# Altium footprint library HedefProjem.PcbLib: 35 footprints (part 2 of 3)
Each footprint in its own frame and in the unit in brackets; x right, y up, seen from the top. Pads: shape width x height; smd on the part's side, far side on the other; paste and mask are expansions set on the pad; w line width, h text height; cw(c..) or ccw(c..) is an arc to the next point about the centre after c.
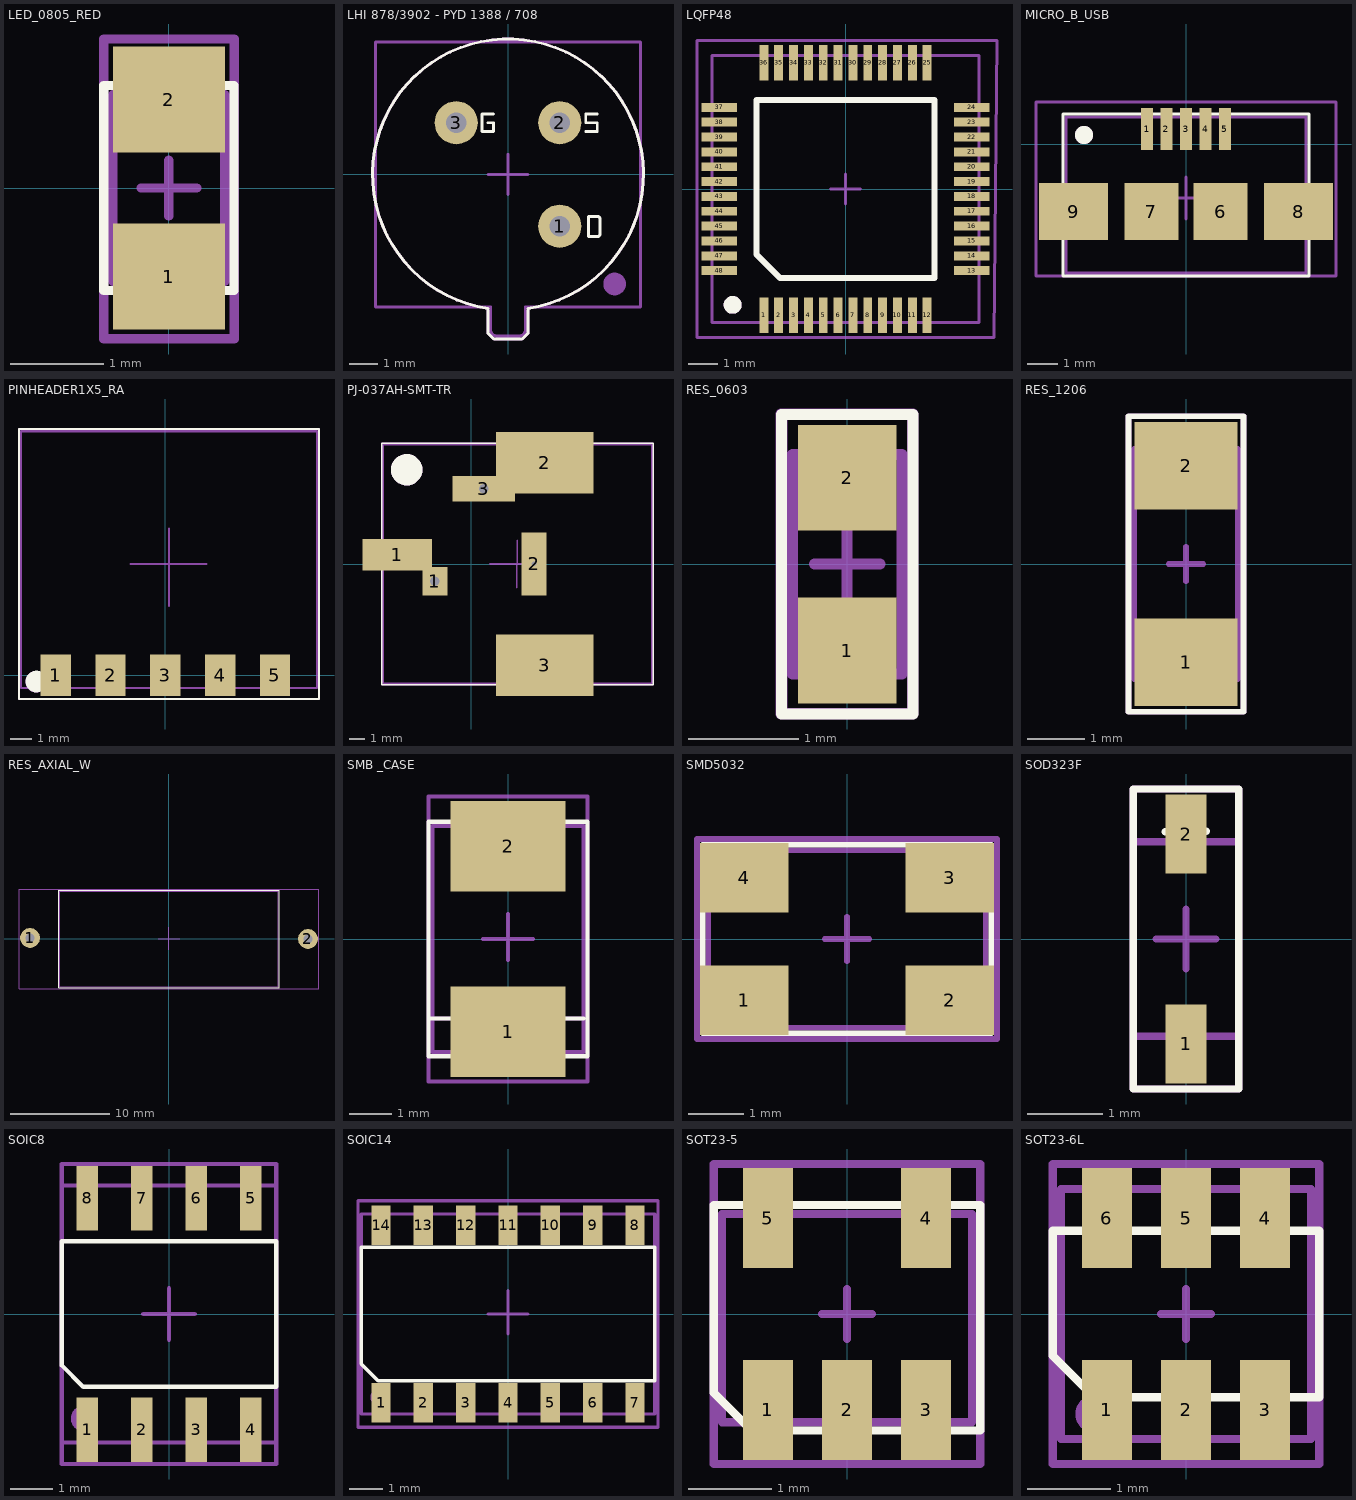
[diagram p1: the footprints below, top view; thin cyan lines are the x and y axes]

## LED_0805_RED [mm]
pads (2):
  rect 1.2x1.14 smd mask+0.05: 1(0,-0.95) 2(0,0.95)
Top Overlay:
  lines w0.1: -0.7,-1.1 -0.7,1.1 0.7,1.1 0.7,-1.1 -0.7,-1.1
Top 3D Body:
  lines w0.1: -0.6,-1 -0.6,1 0.6,1 0.6,-1 -0.6,-1
Top Component Center:
  lines w0.1: -0.3,0 0.3,0 ; 0,-0.3 0,0.3 ; -0.7,-1.618 0.699,-1.618 0.699,1.6 -0.7,1.6 -0.7,-1.618
Top Designator:
  lines w0.1: -0.698,-1.62 -0.698,1.6 0.703,1.6 0.703,-1.62 -0.698,-1.62
  text ".Designator" at 0.133,-0.8 h0.5
3D body "0805LED-RED.step": height 0.8, standoff -0.31, extent -0.625,-1 0.625,1

## LHI 878/3902 - PYD 1388 / 708 [mm]
pads (3):
  round 1.5 hole 0.7 mask+0.05: 1(1.796,-1.796) 2(1.796,1.796) 3(-1.796,1.796)
Top Overlay:
  lines w0.1: -0.69,1.796 -0.504,1.796 -0.504,1.496 -0.904,1.496 -0.904,2.096 -0.504,2.096 ; 2.696,1.496 3.096,1.496 3.096,1.796 2.696,1.796 2.696,2.096 3.096,2.096 ; -0.7,-5.5 -0.491,-5.709 ; -0.7,-5.5 -0.7,-4.699 -0.7,-5.5 ; -0.7,-5.5 -0.491,-5.709 ; -0.491,-5.709 0.4,-5.709 -0.491,-5.709 ; 0.491,-5.709 0.373,-5.709 0.491,-5.709 ; 0.491,-5.709 0.7,-5.5 ; 0.491,-5.709 0.7,-5.5 ; 0.7,-5.5 0.7,-5.3 ; 0.7,-5.5 0.7,-5.3 ; 0.7,-5.3 0.7,-4.9 ; 0.7,-5.3 0.7,-4.9 ; 0.7,-4.9 0.7,-4.7 0.7,-4.9 ; 2.796,-2.154 2.796,-1.454 ; 2.796,-2.154 3.096,-2.154 ccw(c3.096,-2.054) 3.196,-2.054 ; 2.796,-2.154 2.796,-1.454 ; 2.796,-1.454 3.096,-1.454 cw(c3.096,-1.554) 3.196,-1.554 ; 3.196,-2.054 3.196,-1.554 ; 3.196,-2.054 3.196,-1.554 ; -0.695,-4.648 cw(c0,0) 0.695,-4.648 ccw(c0,0) -0.695,-4.648
Top 3D Body:
  circle w0.5: c3.7,-3.8 r0.141
  lines w0.1: -0.374,-5.6 ccw(c-0.374,-5.6) -0.374,-5.6 -0.3,-5.6 0.4,-5.6 ccw(c0.4,-5.4) 0.6,-5.4 0.6,-4.6 4.6,-4.6 4.6,4.6 -4.6,4.6 -4.6,-4.6 -0.6,-4.6 ; 0.3,-5.6 -0.4,-5.6 cw(c-0.4,-5.4) -0.6,-5.4 ; -0.6,-5.4 -0.6,-4.6 ; -0.6,-5.4 -0.6,-4.6
Top Component Center:
  lines w0.1: -0.7,-4.699 -0.7,-5.5 -0.491,-5.709 0.4,-5.709 ; -0.7,0 0.7,0 ; -0.695,-4.648 cw(c0,0) 0.695,-4.648 ; 0,-0.7 0,0.7 ; 0.373,-5.709 0.491,-5.709 0.7,-5.5 0.7,-5.3 0.7,-4.9 0.7,-4.7
Top Designator:
  lines w0.1: -0.7,-4.699 -0.7,-5.5 -0.491,-5.709 0.4,-5.709 ; -0.695,-4.648 cw(c0,0) 0.695,-4.648 ; 0.373,-5.709 0.491,-5.709 0.7,-5.5 0.7,-5.3 0.7,-4.9 0.7,-4.7
  text ".Designator" at -2.046,-0.538 h1.52
3D body: height 5.7, standoff 2, extent -4.05,-4.05 4.05,4.05
3D body: height 1.5, standoff -11.7, extent -2.046,1.546 -1.546,2.046
3D body: height 1.5, standoff -11.7, extent 1.546,1.546 2.046,2.046
3D body: height 1.5, standoff -11.7, extent 1.546,-2.046 2.046,-1.546
3D body: height 2, standoff 1.5, extent -4.6,-4.6 4.6,4.6
3D body: height 5.71, standoff 5.7, extent -1.7,-2.3 1.7,2.3
3D body: height 6, standoff 5.7, extent 1.2,-2.8 2.2,-1.8
3D body: height 6, standoff 5.7, extent -2.2,-2.8 -1.2,-1.8
3D body: height 6, standoff 5.7, extent -2.2,1.8 -1.2,2.8
3D body: height 6, standoff 5.7, extent 1.2,1.8 2.2,2.8
3D body: height 2, standoff 1.5, extent -0.6,-5.6 0.6,-4.4

## LQFP48 [mm] "7mmx7mm"
pads (48):
  rect 0.3x1.2 smd mask+0.05: 1(-2.75,-4.25) 2(-2.25,-4.25) 3(-1.75,-4.25) 4(-1.25,-4.25) 5(-0.75,-4.25) 6(-0.25,-4.25) 7(0.25,-4.25) 8(0.75,-4.25) 9(1.25,-4.25) 10(1.75,-4.25) 11(2.25,-4.25) 12(2.75,-4.25) 25(2.75,4.25) 26(2.25,4.25) 27(1.75,4.25) 28(1.25,4.25) 29(0.75,4.25) 30(0.25,4.25) 31(-0.25,4.25) 32(-0.75,4.25) 33(-1.25,4.25) 34(-1.75,4.25) 35(-2.25,4.25) 36(-2.75,4.25)
  rect 1.2x0.3 smd mask+0.05: 13(4.25,-2.75) 14(4.25,-2.25) 15(4.25,-1.75) 16(4.25,-1.25) 17(4.25,-0.75) 18(4.25,-0.25) 19(4.25,0.25) 20(4.25,0.75) 21(4.25,1.25) 22(4.25,1.75) 23(4.25,2.25) 24(4.25,2.75) 37(-4.25,2.75) 38(-4.25,2.25) 39(-4.25,1.75) 40(-4.25,1.25) 41(-4.25,0.75) 42(-4.25,0.25) 43(-4.25,-0.25) 44(-4.25,-0.75) 45(-4.25,-1.25) 46(-4.25,-1.75) 47(-4.25,-2.25) 48(-4.25,-2.75)
Top Overlay:
  circle w0.3: c-3.8,-3.9 r0.15
  lines w0.2: -3,-2.2 -2.2,-3 3,-3 3,3 -3,3 -3,-2.2
Top 3D Body:
  circle w0.3: c-3.8,-3.9 r0.15
  lines w0.1: -4.5,-4.5 4.5,-4.5 4.5,4.5 -4.5,4.5 -4.5,-4.5
Top Component Center:
  lines w0.1: -5,1.6 -5,5 5.1,5 5,-5 -5,-5 -5,1.9 ; -0.5,0 0.5,0 ; 0,-0.5 0,0.5
Top Designator:
  lines w0.1: -5,-5 5,-5 5.1,5 -5,5 -5,-5
  text ".Designator" at -1.718,-0.708 h1.52
3D body "LQFP48-7x7-0_50-User Library-P-.step": height 1.49, standoff 0.04, extent -4.5,-4.5 4.5,4.5

## MICRO_B_USB [mm]
pads (9):
  rect 0.4x1.4 smd: 1(-1.3,0.5) 2(-0.65,0.5) 3(0,0.5) 4(0.65,0.5) 5(1.3,0.5)
  rect 1.8x1.9 smd: 6(1.15,-2.25) 7(-1.15,-2.25)
  rect 2.3x1.9 smd: 8(3.75,-2.25) 9(-3.75,-2.25)
Top Overlay:
  circle w0.4: c-3.4,0.3 r0.1
  lines w0.1: -4.1,-4.4 4.1,-4.4 4.1,1 -4.1,1 -4.1,-4.4
Top 3D Body:
  circle w0.4: c-3.4,0.3 r0.1
  lines w0.1: -4,-4.3 4,-4.3 4,0.9 -4,0.9 -4,-4.3
Top Component Center:
  lines w0.1: -0.8,-1.8 1,-1.8 ; 0,-2.5 0,-1.1 ; -5,-4.4 -5,1.4 5,1.4 5,-4.4 -5,-4.4
Top Designator:
  lines w0.1: -5,-4.4 -5,1.4 5,1.4 5,-4.4 -5,-4.4
  text ".Designator" at -3.346,-2.238 h1.52
3D body "USB_micro_smd_1.stp": height 2.75, standoff -0.5, extent -4.031,-4.3 4.031,0.9

## PINHEADER1X5_RA [mm]
pads (5):
  rect 1.4x1.91 smd mask+0.05: 1(-5.08,0) 2(-2.54,0) 3(0,0) 4(2.54,0) 5(5.08,0)
Top Overlay:
  circle w0.5: c-5.974,-0.295 r0.25
  lines w0.1: -6.78,-1.1 7.12,-1.1 7.12,11.4 -6.78,11.4 -6.78,-1.1
Top 3D Body:
  circle w0.5: c-5.98,-0.3 r0.25
  lines w0.1: -6.68,-0.6 7.02,-0.6 7.02,11.3 -6.68,11.3 -6.68,-0.6
Top Component Center:
  lines w0.1: -1.6,5.15 1.9,5.15 ; 0.17,3.2 0.17,6.8 ; -6.78,-1.1 7.12,-1.1 7.12,11.4 -6.78,11.4 -6.78,-1.1
Top Designator:
  lines w0.1: -6.78,-1.1 7.12,-1.1 7.12,11.4 -6.78,11.4 -6.78,-1.1
  text ".Designator" at -4.726,3.962 h1.52
3D body: height 2.42, standoff 0.1, extent -6.7,2.745 7.02,11.255
3D body: height 0.41, standoff 0, extent -2.935,-0.57 -2.145,0.57
3D body: height 0.41, standoff 0, extent -0.395,-0.57 0.395,0.57
3D body: height 0.41, standoff 0, extent 2.145,-0.57 2.935,0.57
3D body: height 0.41, standoff 0, extent 4.685,-0.57 5.475,0.57
3D body: height 0.51, standoff 0, extent -5.475,-0.57 -4.685,0.57
3D body: height 1.41, standoff 1, extent -2.935,0.6 -2.145,2.77
3D body: height 1.41, standoff 1, extent -0.395,0.6 0.395,2.77
3D body: height 1.41, standoff 1, extent 2.145,0.6 2.935,2.77
3D body: height 1.41, standoff 1, extent 4.685,0.6 5.475,2.77
3D body: height 1.41, standoff 1, extent -5.475,0.6 -4.685,2.77
3D body: height 1.41, standoff 0, extent -5.475,0.515 -4.685,0.885
3D body: height 1.41, standoff 0, extent -2.935,0.515 -2.145,0.885
3D body: height 1.41, standoff 0, extent -0.395,0.515 0.395,0.885
3D body: height 1.41, standoff 0, extent 2.145,0.515 2.935,0.885
3D body: height 1.41, standoff 0, extent 4.685,0.515 5.475,0.885

## PJ-037AH-SMT-TR [mm]
pads (6):
  rect 4.4x2 smd paste+0 mask+0.05: 1(-4.7,0.6)
  rect 1.6x1.8 hole 0.6 square mask+0.05: 1(-2.303,-1.097)
  rect 1.6x4 hole 0.3 square mask+0.05: 2(4.007,0.007)
  rect 6.2x3.9 smd mask+0.05: 2(4.7,6.45) 3(4.7,-6.45)
  rect 4x1.6 hole 0.6 square mask+0.05: 3(0.801,4.788)
Top Overlay:
  circle w1: c-4.1,6 r0.5
  lines w0.1: -5.7,-7.7 11.6,-7.7 11.6,7.7 -5.7,7.7 -5.7,-7.7
Top 3D Body:
  circle w1: c-4.1,6 r0.5
  lines w0.1: -5.6,-7.6 -5.6,7.6 11.5,7.6 11.5,-7.6 -5.6,-7.6
Top Component Center:
  lines w0.1: 1.2,0 4.7,0 ; 2.92,-1.5 2.93,1.5 ; -5.7,-7.7 11.6,-7.7 11.6,7.7 -5.7,7.7 -5.7,-7.7
Top Designator:
  lines w0.1: -5.7,-7.7 11.6,-7.7 11.6,7.7 -5.7,7.7 -5.7,-7.7
  text ".Designator" at -1.446,0.062 h1.52
3D body "PJ-037AH-SMT-TR.step": height 11.2, standoff -3.2, extent -5.6,-7.6 11.5,7.6

## RES_0603 [mm]
pads (2):
  rect 0.9x0.965 smd mask+0.05: 1(0,-0.787) 2(0,0.788)
Top Overlay:
  lines w0.1: -0.6,-1.364 -0.6,1.363 0.601,1.363 0.601,-1.364 -0.6,-1.364
Top 3D Body:
  lines w0.1: -0.5,-1 0.5,-1 0.5,1 -0.5,1 -0.5,-1
Top Component Center:
  lines w0.1: -0.3,0 0.3,0 ; 0,-0.3 0,0.3 ; -0.595,-1.359 -0.595,1.363 0.596,1.363 0.596,-1.359 -0.595,-1.359
Top Designator:
  lines w0.1: -0.605,-1.364 -0.605,1.368 0.601,1.368 0.601,-1.364 -0.605,-1.364
  text ".Designator" at 0.05,-1.05 h0.3
3D body "0603S1.STEP": height 0.48, standoff 0.03, extent -0.49,-1 0.49,0.977

## RES_1206 [mm]
pads (2):
  rect 1.8x1.52 smd mask+0.05: 1(0,-1.71) 2(0,1.71)
Top Overlay:
  lines w0.1: -1,-2.571 -1,2.57 1,2.57 1,-2.571 -1,-2.571
Top 3D Body:
  lines w0.1: -0.9,-2 -0.9,2 0.9,2 0.9,-2 -0.9,-2
Top Component Center:
  lines w0.1: -0.3,0 0.3,0 ; 0,-0.3 0,0.3 ; -1,-2.572 -1,2.569 1,2.569 1,-2.572 -1,-2.572
Top Designator:
  lines w0.1: -1.001,-2.573 -1.001,2.57 1.001,2.57 1.001,-2.573 -1.001,-2.573
  text ".Designator" at 0.25,-0.65 h0.6
3D body "res1206r.STEP": height 0.65, standoff 0.1, extent -0.938,-1.984 0.938,1.984

## RES_AXIAL_W [mm]
pads (2):
  round 2 hole 0.9 mask+0.05: 1(-14,0.1) 2(14,0)
Top Overlay:
  lines w0.1: -11.1,-4.9 -11.1,4.9 11.1,4.9 11.1,-4.9 -11.1,-4.9
Top 3D Body:
  lines w0.1: -11,-4.8 -11,4.8 11,4.8 11,-4.8 -11,-4.8
Top Component Center:
  lines w0.1: -1.1,0 1.1,0 ; 0,-1.1 0,1.2 ; -15.115,-5.018 15.117,-5.018 15.117,5 -15.1,5 -15.115,4.985 -15.115,-4.851 -15.115,-5.018
Top Designator:
  lines w0.1: -15.1,-5.018 15.107,-5.018 15.107,5 -15.1,5 -15.1,-5.018
  text ".Designator" at -8.246,-1.638 h1.52
3D body: height 9.75, standoff 0.1, extent -11,-4.825 11,4.825
3D body: height 5.38, standoff 4.57, extent 10.7,-0.4 14.4,0.4
3D body: height 5.47, standoff -25.53, extent 13.6,-0.4 14.4,0.4
3D body: height 5.47, standoff -25.53, extent -14.4,-0.3 -13.6,0.5
3D body: height 5.38, standoff 4.57, extent -14.4,-0.3 -10.7,0.5

## SMB _CASE [mm]
pads (2):
  rect 2.743x2.159 smd mask+0.05: 1(0,-2.21) 2(0,2.21)
Top Overlay:
  lines w0.1: -1.9,-1.9 1.8,-1.9 ; -1.9,-2.8 1.9,-2.8 1.9,2.8 -1.9,2.8 -1.9,-2.8
Top 3D Body:
  lines w0.1: -1.8,-1.9 1.8,-1.9 ; -1.8,-2.7 1.8,-2.7 1.8,2.7 -1.8,2.7 -1.8,-2.7
Top Component Center:
  lines w0.1: -0.6,0 0.6,0 ; 0,-0.5 0,0.6 ; -1.9,-3.4 1.9,-3.4 1.9,3.4 -1.9,3.4 -1.9,-3.4
Top Designator:
  lines w0.1: -1.9,-3.4 1.9,-3.4 1.9,3.4 -1.9,3.4 -1.9,-3.4
  text ".Designator" at 0.538,-1.646 h1.52
3D body "SMB-403A-03_rotated.STEP": height 2.31, standoff 0, extent -1.78,-2.72 1.78,2.72

## SMD5032 [mm]
pads (4):
  rect 1.6x1.25 smd mask+0.05: 1(-1.85,-1.1) 2(1.85,-1.1) 3(1.85,1.1) 4(-1.85,1.1)
Top Overlay:
  circle w0.254: c-2.248,-1.35 r0.1
  lines w0.1: -2.6,-1.7 2.6,-1.7 2.6,1.7 -2.6,1.7 -2.6,-1.7
Top 3D Body:
  circle w0.254: c-2.186,-1.274 r0.1
  lines w0.1: -2.5,-1.6 2.5,-1.6 2.5,1.6 -2.5,1.6 -2.5,-1.6
Top Component Center:
  lines w0.1: -0.4,0 0.4,0 ; 0,-0.4 0,0.4 ; -2.7,-1.8 2.7,-1.8 2.7,1.8 -2.7,1.8 -2.7,-1.8
Top Designator:
  lines w0.1: -2.7,-1.8 2.7,-1.8 2.7,1.8 -2.7,1.8 -2.7,-1.8
  text ".Designator" at -1.446,-0.538 h1.52
3D body "Crystal_SMD5032.step": height 0.85, standoff -0.01, extent -2.5,-1.6 2.443,1.6

## SOD323F [mm]
pads (2):
  rect 0.55x1.05 smd mask+0.05: 1(0,-1.4) 2(0,1.4)
Top Overlay:
  lines w0.1: -0.275,1.428 0.27,1.439 ; -0.2,-1.5 0.2,-1.5 ; 0,1.2 0,1.7 ; -0.7,-2 -0.7,2 0.7,2 0.7,-2 -0.7,-2
Top 3D Body:
  lines w0.1: -0.7,-1.3 0.7,-1.3 0.7,1.3 -0.7,1.3 -0.7,-1.3
Top Component Center:
  lines w0.1: -0.4,0 0.4,0 ; 0,-0.4 0,0.4 ; -0.7,-2 0.7,-2 0.7,2 -0.7,2 -0.7,-2
Top Designator:
  lines w0.1: -0.7,-2 0.7,-2 0.7,2 -0.7,2 -0.7,-2
  text ".Designator" at 0.233,-0.9 h0.5
3D body "SOD323F.step": height 1, standoff 0, extent -0.675,-1.25 0.675,1.25

## SOIC8 [mm]
pads (8):
  rect 0.5x1.5 smd mask+0.05: 1(-1.905,-2.7) 2(-0.635,-2.7) 3(0.635,-2.7) 4(1.905,-2.7) 5(1.905,2.7) 6(0.635,2.7) 7(-0.635,2.7) 8(-1.905,2.7)
Top Overlay:
  lines w0.1: -2.5,-1.2 -2,-1.7 2.5,-1.7 2.5,1.7 -2.5,1.7 -2.5,-1.2
Top 3D Body:
  circle w0.3: c-1.99,-2.441 r0.15
  lines w0.1: -2.5,-3 -2.5,3 2.5,3 2.5,-3 -2.5,-3
Top Component Center:
  lines w0.1: -0.6,0 0.6,0 ; 0,-0.6 0,0.6 ; -2.5,-3.5 -2.5,3.5 2.5,3.5 2.5,-3.5 -2.5,-3.5
Top Designator:
  lines w0.1: -2.5,-3.5 -2.5,3.5 2.5,3.5 2.5,-3.5 -2.5,-3.5
  text ".Desingnator" at -1.458,-0.246 h1
3D body "User Library-so8-3.step": height 1.8, standoff 0.1, extent -2.45,-3 2.45,3

## SOIC14 [mm]
pads (14):
  rect 0.58x1.18 smd mask+0.05: 1(-3.81,-2.66) 2(-2.54,-2.66) 3(-1.27,-2.66) 4(0,-2.66) 5(1.27,-2.66) 6(2.54,-2.66) 7(3.81,-2.66) 8(3.81,2.66) 9(2.54,2.66) 10(1.27,2.66) 11(0,2.66) 12(-1.27,2.66) 13(-2.54,2.66) 14(-3.81,2.66)
Top Overlay:
  lines w0.1: -4.4,-1.5 -4.4,2 4.4,2 4.4,-2 -3.9,-2 -4.4,-1.5
Top 3D Body:
  circle w0.254: c-3.9,-2.5 r0.1
  lines w0.1: -4.4,-3 4.4,-3 4.4,3 -4.4,3 -4.4,-3
Top Component Center:
  lines w0.1: -0.6,0 0.6,0 ; 0,-0.6 0,0.7 ; -4.5,-3.4 4.5,-3.4 4.5,3.4 -4.5,3.4 -4.5,-3.4
Top Designator:
  lines w0.1: -4.5,-3.4 4.5,-3.4 4.5,3.4 -4.5,3.4 -4.5,-3.4
  text ".Designator" at -2.346,-0.738 h1.52
3D body "SOIC14.step": height 1.8, standoff 0.1, extent -4.4,-3 4.4,3

## SOT23-5 [mm]
pads (5):
  rect 0.6x1.2 smd mask+0.05: 1(-0.95,-1.15) 2(0,-1.15) 3(0.95,-1.15) 4(0.95,1.15) 5(-0.95,1.15)
Top Overlay:
  lines w0.1: -1.6,-0.943 -1.6,1.308 1.6,1.308 1.6,-1.399 -1.144,-1.399 -1.6,-0.943
Top 3D Body:
  circle w0.254: c-1,-1 r0.1
  lines w0.1: -1.5,-1.3 1.5,-1.3 1.5,1.2 -1.5,1.2 -1.5,-1.3
Top Component Center:
  lines w0.1: -0.3,0 0.3,0 ; 0,-0.3 0,0.3 ; -1.6,-1.8 -1.6,1.8 1.6,1.8 1.6,-1.8 -1.6,-1.8
Top Designator:
  lines w0.1: -1.6,-1.8 -1.6,1.8 1.6,1.8 1.6,-1.8 -1.6,-1.8
  text ".Designator" at -0.95,-0.367 h0.85
3D body "SOT-23-5.step": height 1.15, standoff 0.05, extent -1.5,-1.25 1.5,1.25

## SOT23-6L [mm]
pads (6):
  rect 0.6x1.2 smd mask+0.05: 1(-0.95,-1.15) 2(0,-1.15) 3(0.95,-1.15) 4(0.95,1.15) 5(0,1.15) 6(-0.95,1.15)
Top Overlay:
  lines w0.1: -1.6,-0.5 -1.1,-1 1.6,-1 1.6,1 -1.6,1 -1.6,-0.5
Top 3D Body:
  circle w0.254: c-1.1,-1.2 r0.1
  lines w0.1: -1.5,-1.5 -1.5,1.5 1.5,1.5 1.5,-1.5 -1.5,-1.5
Top Component Center:
  lines w0.1: -0.3,0 0.3,0 ; 0,-0.3 0,0.3 ; -1.6,-1.8 1.6,-1.8 1.6,1.8 -1.6,1.8 -1.6,-1.8
Top Designator:
  lines w0.1: -1.6,-1.8 1.6,-1.8 1.6,1.8 -1.6,1.8 -1.6,-1.8
  text ".Designator" at -0.95,-0.367 h0.85
3D body "SOT-23-6L.step": height 1.45, standoff 0.05, extent -1.524,-1.5 1.524,1.5